# Altium footprint library hphonglib.PcbLib: 1250 footprints (part 48 of 79)
Each footprint in its own frame and in the unit in brackets; x right, y up, seen from the top. Pads: shape width x height; smd on the part's side, far side on the other; paste and mask are expansions set on the pad; w line width, h text height; cw(c..) or ccw(c..) is an arc to the next point about the centre after c.
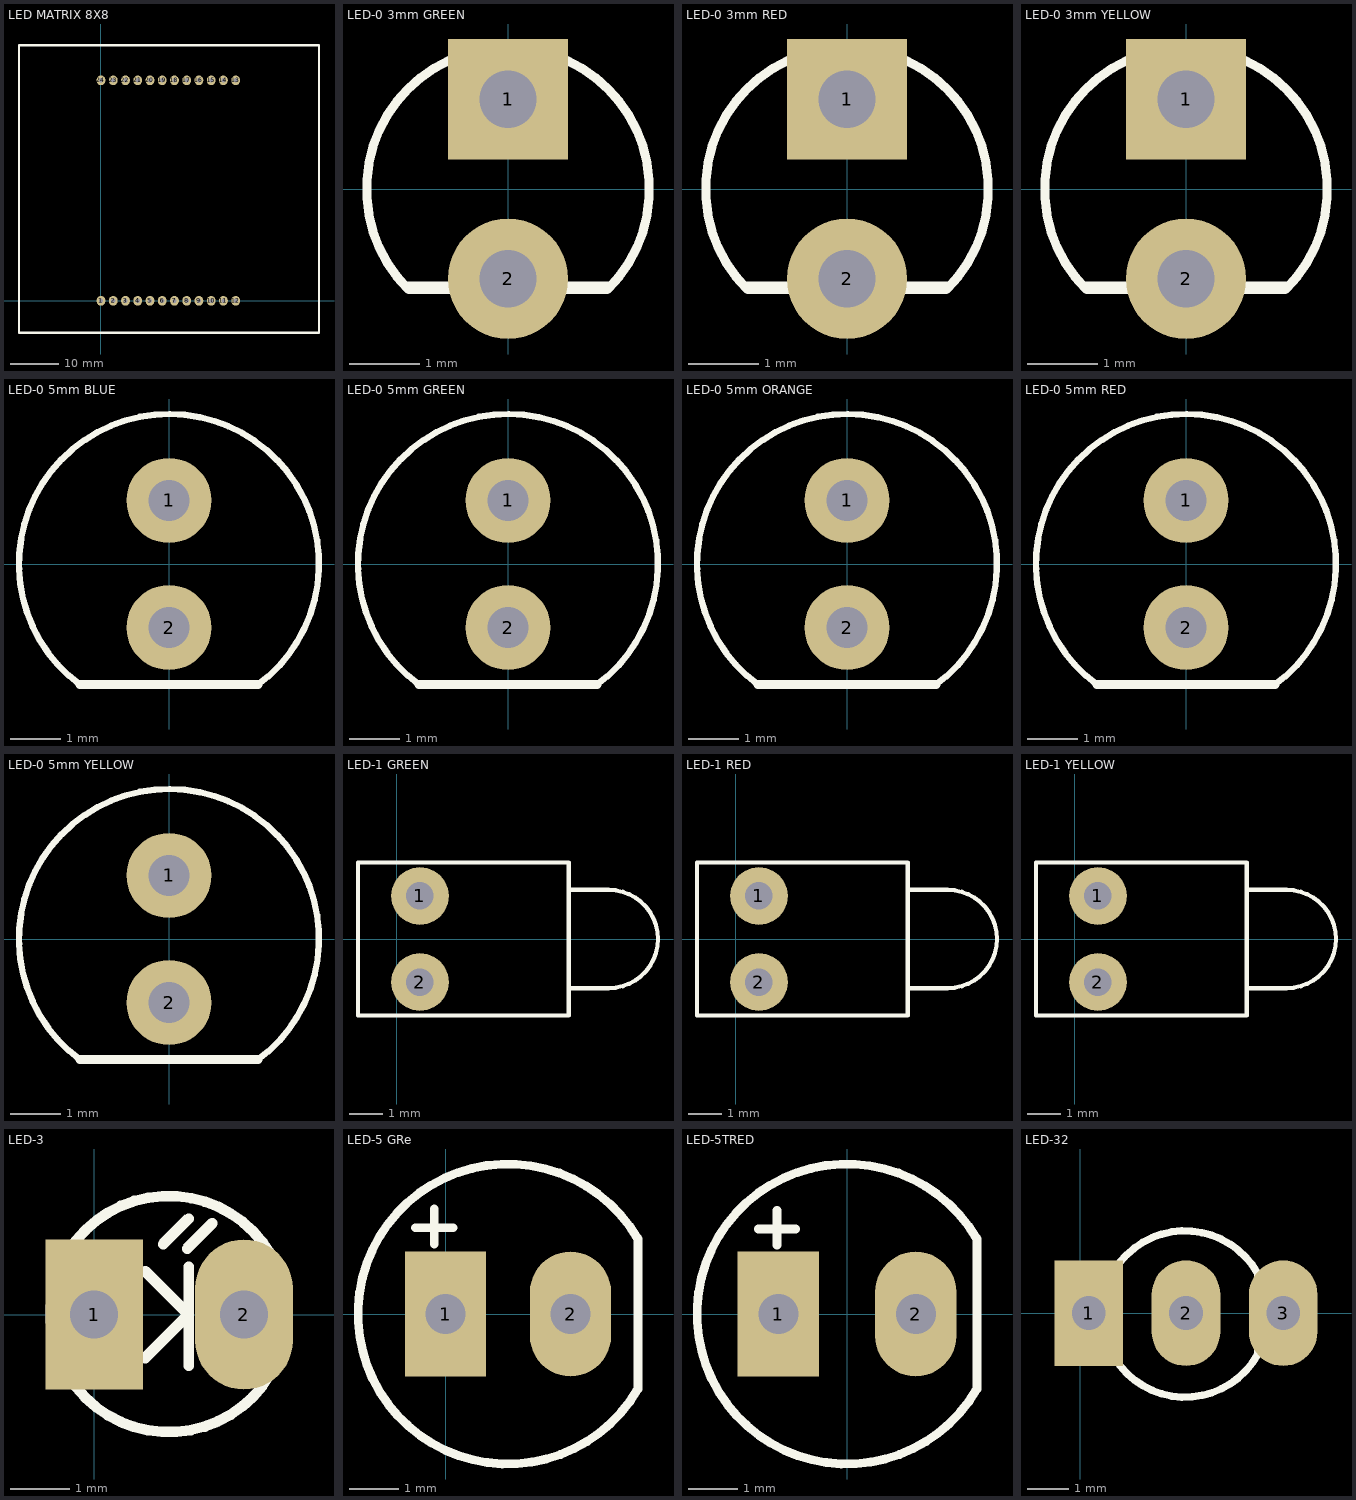
[diagram p47: the footprints below, top view; thin cyan lines are the x and y axes]

## LED MATRIX 8X8 [mm]
pads (24):
  oval 1.8x2 hole 0.9: 1(0,0) 2(2.54,0) 3(5.08,0) 4(7.62,0) 5(10.16,0) 6(12.7,0) 7(15.24,0) 8(17.78,0) 9(20.32,0) 10(22.86,0) 11(25.4,0) 12(27.94,0) 13(27.94,45.72) 14(25.4,45.72) 15(22.86,45.72) 16(20.32,45.72) 17(17.78,45.72) 18(15.24,45.72) 19(12.7,45.72) 20(10.16,45.72) 21(7.62,45.72) 22(5.08,45.72) 23(2.54,45.72) 24(0,45.72)
Top Overlay:
  lines w0.5: -17.006,-6.65 -17.006,53.04 -2.401,53.04 45.224,53.04 45.224,-6.65 -17.006,-6.65

## LED-0 3mm GREEN [mil] "Typical LED; GREEN; RED; 2 Leads; Solder Pad 35mil"
pads (2):
  rect 67x67 hole 32: 1(0,50)
  round 67 hole 32: 2(0,-50)
Top Overlay:
  lines w5: -55.68,-55.68 cw(c0,0) 55.68,-55.68
  lines w7: -55,-55 55,-55
3D body "SW3dPS-LEDd3G.STEP": height 207.04, standoff -107.93, extent -63.57,-65.51 65.91,64.42

## LED-0 3mm RED [mil] "Typical LED; RED; 2 Leads; Solder Pad 35mil"
pads (2):
  rect 67x67 hole 32: 1(0,50)
  round 67 hole 32: 2(0,-50)
Top Overlay:
  lines w5: -55.68,-55.68 cw(c0,0) 55.68,-55.68
  lines w7: -55,-55 55,-55
3D body "SW3dPS-LEDd3R.STEP": height 207.04, standoff -107.93, extent -63.57,-65.51 65.91,64.42

## LED-0 3mm YELLOW [mil] "Typical LED; YELLOW; RED; 2 Leads; Solder Pad 35mil"
pads (2):
  rect 67x67 hole 32: 1(0,50)
  round 67 hole 32: 2(0,-50)
Top Overlay:
  lines w5: -55.68,-55.68 cw(c0,0) 55.68,-55.68
  lines w7: -55,-55 55,-55
3D body "SW3dPS-LEDd3Y.STEP": height 207.04, standoff -107.93, extent -63.57,-65.51 65.91,64.42

## LED-0 5mm BLUE [mil] "Typical LED; BLUE; 2 Leads; Solder Pad 35mil"
pads (2):
  round 67 hole 32: 1(0,50) 2(0,-50)
Top Overlay:
  lines w5: -70.06,-95.09 cw(c0,0) 69.15,-95.75
  lines w7: -70,-95 70,-95
3D body "User Library-LEDd5B.STEP": height 344.75, standoff -237.93, extent -118,-96.19 118.99,117.2

## LED-0 5mm GREEN [mil] "Typical LED; GREEN; 2 Leads; Solder Pad 35mil"
pads (2):
  round 67 hole 32: 1(0,50) 2(0,-50)
Top Overlay:
  lines w5: -70.06,-95.09 cw(c0,0) 69.15,-95.75
  lines w7: -70,-95 70,-95
3D body "SW3dPS-LEDd5O.STEP": height 344.75, standoff -237.93, extent -118,-96.19 118.99,117.2

## LED-0 5mm ORANGE [mil] "Typical LED; ORANGE; 2 Leads; Solder Pad 35mil"
pads (2):
  round 67 hole 32: 1(0,50) 2(0,-50)
Top Overlay:
  lines w5: -70.06,-95.09 cw(c0,0) 69.15,-95.75
  lines w7: -70,-95 70,-95
3D body "SW3dPS-LEDd5G.STEP": height 344.75, standoff -237.93, extent -118,-96.19 118.99,117.2

## LED-0 5mm RED [mil] "Typical LED; RED; 2 Leads; Solder Pad 35mil"
pads (2):
  round 67 hole 32: 1(0,50) 2(0,-50)
Top Overlay:
  lines w5: -70.06,-95.09 cw(c0,0) 69.15,-95.75
  lines w7: -70,-95 70,-95
3D body "SW3dPS-LEDd5R.STEP": height 344.75, standoff -237.93, extent -118,-96.19 118.99,117.2

## LED-0 5mm YELLOW [mil] "Typical LED; YELLOW; 2 Leads; Solder Pad 35mil"
pads (2):
  round 67 hole 32: 1(0,50) 2(0,-50)
Top Overlay:
  lines w5: -70.06,-95.09 cw(c0,0) 69.15,-95.75
  lines w7: -70,-95 70,-95
3D body "SW3dPS-LEDd5Y.STEP": height 344.75, standoff -237.93, extent -118,-96.19 118.99,117.2

## LED-1 GREEN [mil] "Typical LED; GREEN; 2 Leads; Solder Pad 35mil"
pads (2):
  round 67 hole 32: 1(27,50) 2(27,-50)
Top Overlay:
  lines w5: 203.23,-57.09 246.54,-57.09 ccw(c246.54,0) 246.54,57.09 203.23,57.09 ; -45,-89 200,-89 200,89 -45,89 -45,-89
3D body "SW3dPS-LEDd3GC.STEP": height 287.9, standoff -97.93, extent -47.43,-91 297.43,91

## LED-1 RED [mil] "Typical LED; RED; 2 Leads; Solder Pad 35mil"
pads (2):
  round 67 hole 32: 1(27,50) 2(27,-50)
Top Overlay:
  lines w5: 203.23,-57.09 246.54,-57.09 ccw(c246.54,0) 246.54,57.09 203.23,57.09 ; -45,-89 200,-89 200,89 -45,89 -45,-89
3D body "SW3dPS-LEDd3RC.STEP": height 287.9, standoff -97.93, extent -47.43,-91 297.43,91

## LED-1 YELLOW [mil] "Typical LED; YELLOW; 2 Leads; Solder Pad 35mil"
pads (2):
  round 67 hole 32: 1(27,50) 2(27,-50)
Top Overlay:
  lines w5: 203.23,-57.09 246.54,-57.09 ccw(c246.54,0) 246.54,57.09 203.23,57.09 ; -45,-89 200,-89 200,89 -45,89 -45,-89
3D body "SW3dPS-LEDd3YC.STEP": height 287.9, standoff -97.93, extent -47.43,-91 297.43,91

## LED-3 [mil] "LED 2 PIN, 3ly Only colour"
height 300
pads (2):
  rect 65x100 hole 32: 1(0,0)
  oval 65x100 hole 32: 2(100,0)
Top Overlay:
  lines w7: 34,-29 63,0 34,29 ; 46,47 63,64 ; 62,44 79,61 ; 63,-34 63,32 ; 117.92,-39.35 117.92,39.84
  lines w7.01: 117.57,-39.74 cw(c49.8,0.35) 117.72,40.19
3D body "SW3DPS-LED DIP 3MM-DEFAULT.STEP": height 217.14, standoff -117.51, extent -12.99,-74.8 124.8,74.81

## LED-5 GRe [mil] "LED 2 PIN, 5 ly , Only colour,pin to pin 100mil"
height 300
pads (2):
  rect 65x100 hole 32: 1(0,0)
  oval 65x100 hole 32: 2(100,0)
Top Overlay:
  lines w7: -24,69 6,69 ; -9,56 -9,84 ; 153.51,60.71 ccw(c50,0) 153.94,-59.97 ; 154,-59 154,60
3D body "SW3dPS-LED green.STEP": height 336.82, standoff -117.51, extent -54.33,-103.65 154.33,105.01

## LED-5TRED [mil] "LED 2 PIN, 5 ly , Only colour, pin to pin 110mil"
height 300
pads (2):
  rect 65x100 hole 32: 1(-55,0)
  oval 65x100 hole 32: 2(55,0)
Top Overlay:
  lines w7: -71,68 -41,68 ; -56,55 -56,83 ; 103.51,60.71 ccw(c0,0) 103.94,-59.97 ; 104,-59 104,60
3D body "SW3dPS-LEDd5R.STEP": height 339.18, standoff -243.49, extent -115.69,-117 97.7,120

## LED-32 [mil] "LED 3 PIN, 3ly Two colour"
height 300
pads (3):
  rect 65x100 hole 32: 1(8,0)
  oval 65x100 hole 32: 2(100,0) 3(192,0)
Top Overlay:
  lines w7: 168,-39 168,37
  lines w7.01: 167.87,37.48 ccw(c99.08,-0.84) 167.97,-38.98